# Altium footprint library Connectors.PcbLib: 199 footprints (part 8 of 13)
Each footprint in its own frame and in the unit in brackets; x right, y up, seen from the top. Pads: shape width x height; smd on the part's side, far side on the other; paste and mask are expansions set on the pad; w line width, h text height; cw(c..) or ccw(c..) is an arc to the next point about the centre after c.
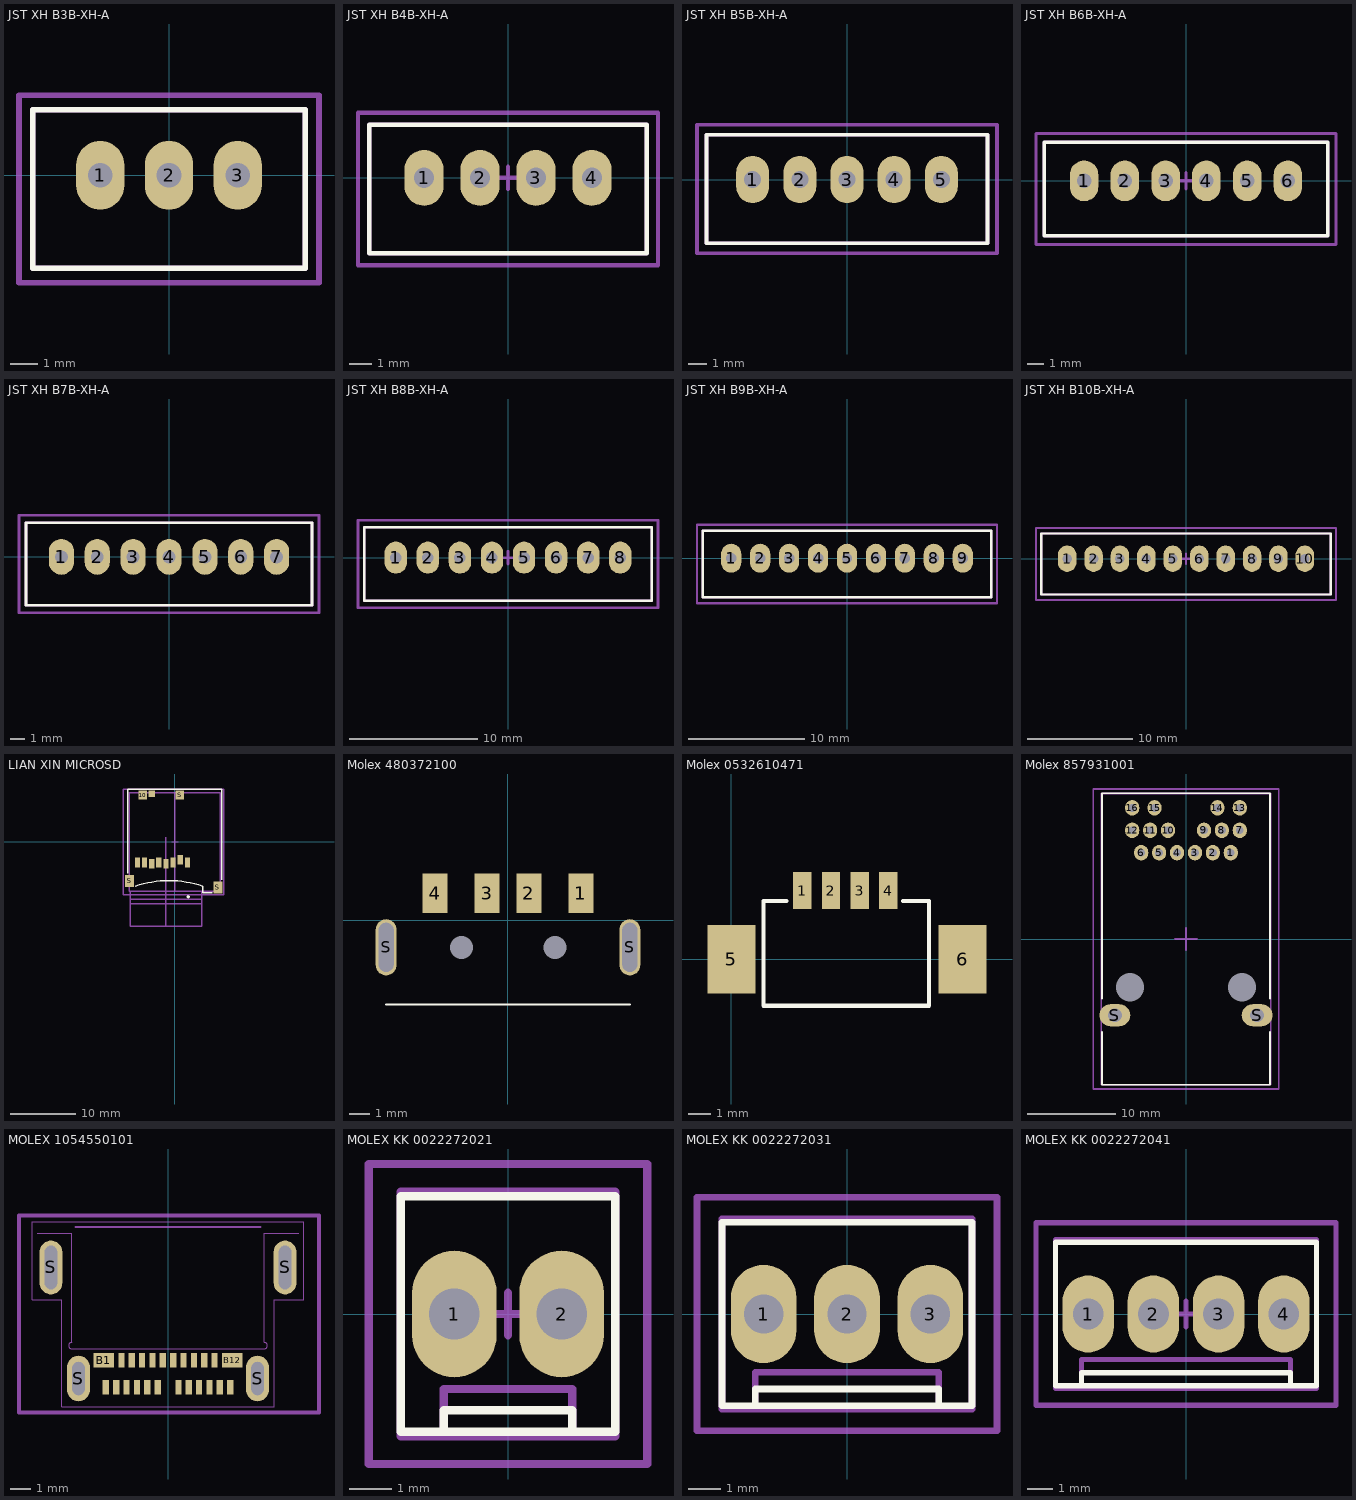
[diagram p7: the footprints below, top view; thin cyan lines are the x and y axes]

## JST XH B3B-XH-A [mm]
height 7
pads (3):
  oval 1.75x2.5 hole 0.9: 1(-2.5,0) 2(0,0) 3(2.5,0)
Top Overlay:
  lines w0.2: -4.95,-3.375 -4.95,2.375 4.95,2.375 4.95,-3.375 -4.95,-3.375
Mechanical 1:
  lines w0.2: -4.95,-3.375 4.95,-3.375 4.95,2.375 -4.95,2.375 -4.95,-3.375
Mechanical 15:
  lines w0.2: -0.5,0 0.5,0 ; 0,-0.5 0,0.5 ; -5.45,-3.9 -5.45,2.9 5.45,2.9 5.45,-3.9 -5.45,-3.9
3D body "JST B3B-XH-A.STEP": height 7, standoff -3.4, extent -4.95,-3.375 4.95,2.375

## JST XH B4B-XH-A [mm]
height 7
pads (4):
  oval 1.75x2.5 hole 0.9: 1(-3.75,0) 2(-1.25,0) 3(1.25,0) 4(3.75,0)
Top Overlay:
  lines w0.2: -6.2,-3.375 6.2,-3.375 6.2,2.375 -6.2,2.375 -6.2,-3.375
Mechanical 1:
  lines w0.2: -6.2,-3.375 -6.2,2.375 6.2,2.375 6.2,-3.375 -6.2,-3.375
Mechanical 15:
  lines w0.2: -0.5,0 0.5,0 ; 0,-0.5 0,0.5 ; -6.7,-3.9 6.7,-3.9 6.7,2.9 -6.7,2.9 -6.7,-3.9
3D body "JST B4B-XH-A.STEP": height 7, standoff -3.4, extent -6.2,-3.375 6.2,2.375

## JST XH B5B-XH-A [mm]
height 7
pads (5):
  oval 1.75x2.5 hole 0.9: 1(-5,0) 2(-2.5,0) 3(0,0) 4(2.5,0) 5(5,0)
Top Overlay:
  lines w0.2: -7.45,-3.375 -7.45,2.375 7.45,2.375 7.45,-3.375 -7.45,-3.375
Mechanical 1:
  lines w0.2: -7.45,-3.375 7.45,-3.375 7.45,2.375 -7.45,2.375 -7.45,-3.375
Mechanical 15:
  lines w0.2: -0.5,0 0.5,0 ; 0,-0.5 0,0.5 ; -7.95,-3.9 -7.95,2.9 7.95,2.9 7.95,-3.9 -7.95,-3.9
3D body "JST B5B-XH-A.STEP": height 7, standoff -3.4, extent -7.45,-3.375 7.45,2.375

## JST XH B6B-XH-A [mm]
height 7
pads (6):
  oval 1.75x2.5 hole 0.9: 1(-6.25,0) 2(-3.75,0) 3(-1.25,0) 4(1.25,0) 5(3.75,0) 6(6.25,0)
Top Overlay:
  lines w0.2: -8.7,-3.375 -8.7,2.375 8.7,2.375 8.7,-3.375 -8.7,-3.375
Mechanical 1:
  lines w0.2: -8.7,-3.375 8.7,-3.375 8.7,2.375 -8.7,2.375 -8.7,-3.375
Mechanical 15:
  lines w0.2: -0.5,0 0.5,0 ; 0,-0.5 0,0.5 ; -9.2,-3.9 -9.2,2.9 9.2,2.9 9.2,-3.9 -9.2,-3.9
3D body "JST B6B-XH-A.STEP": height 7, standoff -3.4, extent -8.7,-3.375 8.7,2.375

## JST XH B7B-XH-A [mm]
height 7
pads (7):
  oval 1.75x2.5 hole 0.9: 1(-7.5,0) 2(-5,0) 3(-2.5,0) 4(0,0) 5(2.5,0) 6(5,0) 7(7.5,0)
Top Overlay:
  lines w0.2: -9.95,-3.375 9.95,-3.375 9.95,2.375 -9.95,2.375 -9.95,-3.375
Mechanical 1:
  lines w0.2: -9.95,-3.375 -9.95,2.375 9.95,2.375 9.95,-3.375 -9.95,-3.375
Mechanical 15:
  lines w0.2: -0.5,0 0.5,0 ; 0,-0.5 0,0.5 ; -10.45,-3.9 10.45,-3.9 10.45,2.9 -10.45,2.9 -10.45,-3.9
3D body "JST B7B-XH-A.STEP": height 7, standoff -3.4, extent -9.95,-3.375 9.95,2.375

## JST XH B8B-XH-A [mm]
height 7
pads (8):
  oval 1.75x2.5 hole 0.9: 1(-8.75,0) 2(-6.25,0) 3(-3.75,0) 4(-1.25,0) 5(1.25,0) 6(3.75,0) 7(6.25,0) 8(8.75,0)
Top Overlay:
  lines w0.2: -11.2,-3.375 11.2,-3.375 11.2,2.375 -11.2,2.375 -11.2,-3.375
Mechanical 1:
  lines w0.2: -11.2,-3.375 -11.2,2.375 11.2,2.375 11.2,-3.375 -11.2,-3.375
Mechanical 15:
  lines w0.2: -0.5,0 0.5,0 ; 0,-0.5 0,0.5 ; -11.7,-3.9 11.7,-3.9 11.7,2.9 -11.7,2.9 -11.7,-3.9
3D body "JST B8B-XH-A.STEP": height 7, standoff -3.4, extent -11.2,-3.375 11.2,2.375

## JST XH B9B-XH-A [mm]
height 7
pads (9):
  oval 1.75x2.5 hole 0.9: 1(-10,0) 2(-7.5,0) 3(-5,0) 4(-2.5,0) 5(0,0) 6(2.5,0) 7(5,0) 8(7.5,0) 9(10,0)
Top Overlay:
  lines w0.2: -12.45,-3.375 12.45,-3.375 12.45,2.375 -12.45,2.375 -12.45,-3.375
Mechanical 1:
  lines w0.2: -12.45,-3.375 -12.45,2.375 12.45,2.375 12.45,-3.375 -12.45,-3.375
Mechanical 15:
  lines w0.2: -0.5,0 0.5,0 ; 0,-0.5 0,0.5 ; -12.95,-3.9 12.95,-3.9 12.95,2.9 -12.95,2.9 -12.95,-3.9
3D body "JST B9B-XH-A.STEP": height 7, standoff -3.4, extent -12.45,-3.375 12.45,2.375

## JST XH B10B-XH-A [mm]
height 7
pads (10):
  oval 1.75x2.5 hole 0.9: 1(-11.25,0) 2(-8.75,0) 3(-6.25,0) 4(-3.75,0) 5(-1.25,0) 6(1.25,0) 7(3.75,0) 8(6.25,0) 9(8.75,0) 10(11.25,0)
Top Overlay:
  lines w0.2: -13.7,-3.375 13.7,-3.375 13.7,2.375 -13.7,2.375 -13.7,-3.375
Mechanical 1:
  lines w0.2: -13.7,-3.375 -13.7,2.375 13.7,2.375 13.7,-3.375 -13.7,-3.375
Mechanical 15:
  lines w0.2: -0.5,0 0.5,0 ; 0,-0.5 0,0.5 ; -14.2,-3.9 14.2,-3.9 14.2,2.9 -14.2,2.9 -14.2,-3.9
3D body "JST B10B-XH-A.STEP": height 7, standoff -3.4, extent -13.7,-3.375 13.7,2.375

## LIAN XIN MICROSD [mm] "3D model is wrong!"
pads (13):
  rect 0.8x1.5 smd paste+0 mask+0: 1(1.93,-3.15) 2(0.83,-2.75) 3(-0.27,-3.15) 4(-1.37,-3.35) 5(-2.47,-3.15) 6(-3.57,-3.35) 7(-4.67,-3.15) 8(-5.77,-3.15)
  rect 1x0.95 smd paste+0 mask+0: 9(-3.57,7.425)
  rect 1.3x1.4 smd paste+0 mask+0: 10(-4.97,7.2) S(0.78,7.2)
  rect 1.4x1.9 smd paste+0 mask+0: S(-6.97,-6) S(6.63,-7)
Top Overlay:
  circle w0.25: c2.055,-8.45 r0.125
  lines w0.2: -7.25,-4.825 -7.25,8.1 7.175,8.1 7.25,8.1 7.25,-5.825 ; -6.125,-6.825 cw(c-0.9,-21.988) 4.325,-6.825 4.325,-7.825 5.725,-7.825
Top Assembly:
  text ".Designator" at 1.217,1.642 h1
Top Courtyard:
  lines w0.2: -7.95,-8.15 7.55,-8.15 7.55,8.15 -7.95,8.15 -7.95,-8.15
Top Component Center:
  lines w0.1: -0.5,0 0.5,0 ; 0,-0.5 0,0.5
Mechanical 15:
  lines w0.2: -6.875,-7.6 -6.875,-8.85 ; -4.95,7.2 -4.95,7.6 ; -3.6,7.2 -3.6,7.6 ; -1.65,-9.5 -1.38,-9.5 ; -1.38,-10.925 -1.38,0.725 ; 0,-7.6 0,7.6 ; 0.78,7.05 0.78,7.6 ; 4.12,-7.6 4.12,-8.85 ; -6.875,-8.85 4.12,-8.85 ; -6.875,-8.85 -6.875,-13 -1.38,-13 ; -6.875,-8.85 -6.875,-9.5 -1.38,-9.5 ; -1.38,-13 -1.38,-7.6 -1.38,-9.5 ; -1.38,-13 4.12,-13 4.12,-8.85 ; -1.38,-9.5 4.12,-9.5 4.12,-8.85 ; -7.025,-7.6 -7.025,7.6 7.025,7.6 7.025,-7.6 -7.025,-7.6
3D body "Conn_TE_Connectivity_2201778-1_eec.STEP": height 1.8, standoff 0, extent -7.09,-8.4 6.94,7.8

## Molex 480372100 [mm]
height 3.1
pads (8):
  rect 1.2x1.9 smd: 1(3.5,1.3) 2(1,1.3) 3(-1,1.3) 4(-3.5,1.3)
  round 0 hole 1.1: 6(2.25,-1.3) 7(-2.225,-1.3)
  oval 1x2.7 hole 0.72 slot 2.35 at 90 deg: S(-5.85,-1.3) S(5.85,-1.3)
Top Overlay:
  lines w0.1: -5.85,-4.05 5.85,-4.05
3D body "Molex 480372100.STEP": height 3, standoff -1.8, extent -6,-19.05 6,1.75

## Molex 0532610471 [mm]
height 3.4
pads (6):
  rect 0.8x1.6 smd: 1(3.1,3) 2(4.35,3) 3(5.6,3) 4(6.85,3)
  rect 2.1x3 smd: 5(0,0) 6(10.1,0)
Top Overlay:
  lines w0.178: 2.413,2.54 1.397,2.54 1.397,-2.032 8.636,-2.032 8.636,2.54 7.493,2.54
3D body "Molex 0532610471.STEP": height 3.4, standoff 0, extent -0.122,-2.1 10.028,3.1

## Molex 857931001 [mm]
height 15.05
pads (20):
  oval 1.6x1.75 hole 0.89: 1(5.075,9.78) 2(3.045,9.78) 3(1.015,9.78) 4(-1.015,9.78) 5(-3.045,9.78) 6(-5.075,9.78) 7(6.095,12.32) 8(4.065,12.32) 9(2.035,12.32) 10(-2.035,12.32) 11(-4.065,12.32) 12(-6.095,12.32) 13(6.095,14.86) 14(3.56,14.86) 15(-3.56,14.86) 16(-6.095,14.86)
  round 0 hole 3.2 unplated: M(-6.35,-5.46) M(6.35,-5.46)
  oval 3.5x2.5 hole 1.57: S(-8.065,-8.64) S(8.065,-8.64)
Top Overlay:
  lines w0.2: -9.525,-10.54 -9.525,-16.509 9.525,-16.509 9.525,-10.54 ; -9.525,-6.73 -9.525,16.511 9.525,16.511 9.525,-6.73
Mechanical 13:
  lines w0.2: -9.595,-16.509 -9.595,16.501 9.595,16.501 9.595,-16.509 -9.595,-16.509
Mechanical 15:
  lines w0.2: -1.27,0 1.27,0 ; 0,-1.27 0,1.27 ; -10.5,-17 -10.5,17 10.5,17 10.5,-17 -10.5,-17
3D body "Molex 857931020.STEP": height 15.05, standoff -3.7, extent -9.595,-16.509 9.595,16.501

## MOLEX 1054550101 [mm]
height 2.27
pads (28):
  rect 0.3x0.7 smd: A1(3,-14.514) A2(2.5,-14.514) A3(2,-14.514) A4(1.5,-14.514) A5(1,-14.514) A6(0.5,-14.514) A7(-0.5,-14.514) A8(-1,-14.514) A9(-1.5,-14.514) A10(-2,-14.514) A11(-2.5,-14.514) A12(-3,-14.514) B2(-2.25,-13.214) B3(-1.75,-13.214) B4(-1.25,-13.214) B5(-0.75,-13.214) B6(-0.25,-13.214) B7(0.25,-13.214) B8(0.75,-13.214) B9(1.25,-13.214) B10(1.75,-13.214) B11(2.25,-13.214)
  rect 1x0.7 smd: B1(-3.1,-13.214) B12(3.1,-13.214)
  oval 1.1x2.6 hole 0.6 slot 2.1 at 90 deg: S(-5.65,-8.744) S(5.65,-8.744)
  oval 1.1x2.2 hole 0.6 slot 1.6 at 90 deg: S(-4.32,-14.104) S(4.32,-14.104)
Mechanical 1:
  lines w0: -6.3,-7.094 -4.65,-7.094 -4.65,-12.364 ccw(c-4.65,-12.514) -4.8,-12.514 ccw(c-4.65,-12.514) -4.65,-12.664 4.65,-12.664 ccw(c4.65,-12.514) 4.8,-12.514 ccw(c4.65,-12.514) 4.65,-12.364 4.65,-7.094 6.3,-7.094 ; -5.95,-9.494 ccw(c-5.65,-9.494) -5.65,-9.794 ccw(c-5.65,-9.494) -5.35,-9.494 -5.35,-7.994 ccw(c-5.65,-7.994) -5.65,-7.694 ccw(c-5.65,-7.994) -5.95,-7.994 -5.95,-9.494 ; -4.62,-14.604 ccw(c-4.32,-14.604) -4.32,-14.904 ccw(c-4.32,-14.604) -4.02,-14.604 -4.02,-13.604 ccw(c-4.32,-13.604) -4.32,-13.304 ccw(c-4.32,-13.604) -4.62,-13.604 -4.62,-14.604 ; 4.02,-14.604 ccw(c4.32,-14.604) 4.32,-14.904 ccw(c4.32,-14.604) 4.62,-14.604 4.62,-13.604 ccw(c4.32,-13.604) 4.32,-13.304 ccw(c4.32,-13.604) 4.02,-13.604 4.02,-14.604 ; 5.35,-9.494 ccw(c5.65,-9.494) 5.65,-9.794 ccw(c5.65,-9.494) 5.95,-9.494 5.95,-7.994 ccw(c5.65,-7.994) 5.65,-7.694 ccw(c5.65,-7.994) 5.35,-7.994 5.35,-9.494
  lines w0.1: -4.47,-6.794 4.47,-6.794
Mechanical 15:
  lines w0.2: -7.191,-15.744 -6.184,-15.744 0.048,-15.744 6.279,-15.744 7.287,-15.744 7.287,-6.236 0.048,-6.236 -7.191,-6.236 -7.191,-15.744
Mechanical 16:
  lines w0.05: -6.55,-10.304 -5.12,-10.304 -5.12,-15.464 5.12,-15.464 5.12,-10.304 6.55,-10.304 6.55,-6.544 -6.55,-6.544 -6.55,-10.304
3D body "Molex 1054550101.stp": height 2.27, standoff -0.89, extent -5.812,-14.669 5.788,-6.769

## MOLEX KK 0022272021 [mm]
height 11.6
pads (2):
  oval 2x3 hole 1.2: 1(-1.27,0) 2(1.27,0)
Top Overlay:
  lines w0.2: -1.524,-2.794 -1.524,-2.286 1.524,-2.286 1.524,-2.794 ; -2.54,-2.794 -2.54,2.794 2.54,2.794 2.54,-2.794 -2.54,-2.794
Mechanical 13:
  lines w0.2: -1.524,-2.9 -1.524,-1.778 1.524,-1.778 1.524,-2.9 ; -2.54,-2.9 -2.54,2.9 2.54,2.9 2.54,-2.9 -2.54,-2.9
Mechanical 15:
  lines w0.2: -0.508,0 0.508,0 ; 0,-0.508 0,0.508 ; -3.302,-3.556 -3.302,3.556 3.302,3.556 3.302,-1.016 3.302,-3.556 -1.016,-3.556 -3.302,-3.556
3D body "MOLEX KK 022272021.STEP": height 11.7, standoff -3.56, extent -2.54,-2.9 2.54,2.9

## MOLEX KK 0022272031 [mm]
height 11.6
pads (3):
  oval 2x3 hole 1.2: 1(-2.54,0) 2(0,0) 3(2.54,0)
Top Overlay:
  lines w0.2: -2.794,-2.794 -2.794,-2.286 2.794,-2.286 2.794,-2.794 ; -3.81,-2.794 3.81,-2.794 3.81,2.794 -3.81,2.794 -3.81,-2.794
Mechanical 13:
  lines w0.2: -2.794,-2.9 -2.794,-1.778 2.794,-1.778 2.794,-2.9 ; -3.81,-2.9 -3.81,2.9 3.81,2.9 3.81,-2.9 -3.81,-2.9
Mechanical 15:
  lines w0.2: -0.508,0 0.508,0 ; 0,-0.508 0,0.508 ; -4.572,-3.556 -4.572,3.556 4.572,3.556 4.572,-1.016 4.572,-3.556 -2.286,-3.556 -4.572,-3.556
3D body "MOLEX KK 022272031.STEP": height 11.7, standoff -3.56, extent -3.81,-2.9 3.81,2.9

## MOLEX KK 0022272041 [mm]
height 11.6
pads (4):
  oval 2x3 hole 1.2: 1(-3.81,0) 2(-1.27,0) 3(1.27,0) 4(3.81,0)
Top Overlay:
  lines w0.2: -4.064,-2.794 -4.064,-2.286 4.064,-2.286 4.064,-2.794 ; -5.08,-2.794 -5.08,2.794 5.08,2.794 5.08,-2.794 -5.08,-2.794
Mechanical 13:
  lines w0.2: -4.064,-2.9 -4.064,-1.778 4.064,-1.778 4.064,-2.9 ; -5.08,-2.9 5.08,-2.9 5.08,2.9 -5.08,2.9 -5.08,-2.9
Mechanical 15:
  lines w0.2: -0.508,0 0.508,0 ; 0,-0.508 0,0.508 ; -5.842,-3.556 -3.556,-3.556 5.842,-3.556 5.842,-1.016 5.842,3.556 -5.842,3.556 -5.842,-3.556
3D body "MOLEX KK 022272041.STEP": height 11.7, standoff -3.56, extent -5.08,-2.9 5.08,2.9